# Altium footprint library vertigo.PcbLib: 115 footprints (part 4 of 8)
Each footprint in its own frame and in the unit in brackets; x right, y up, seen from the top. Pads: shape width x height; smd on the part's side, far side on the other; paste and mask are expansions set on the pad; w line width, h text height; cw(c..) or ccw(c..) is an arc to the next point about the centre after c.
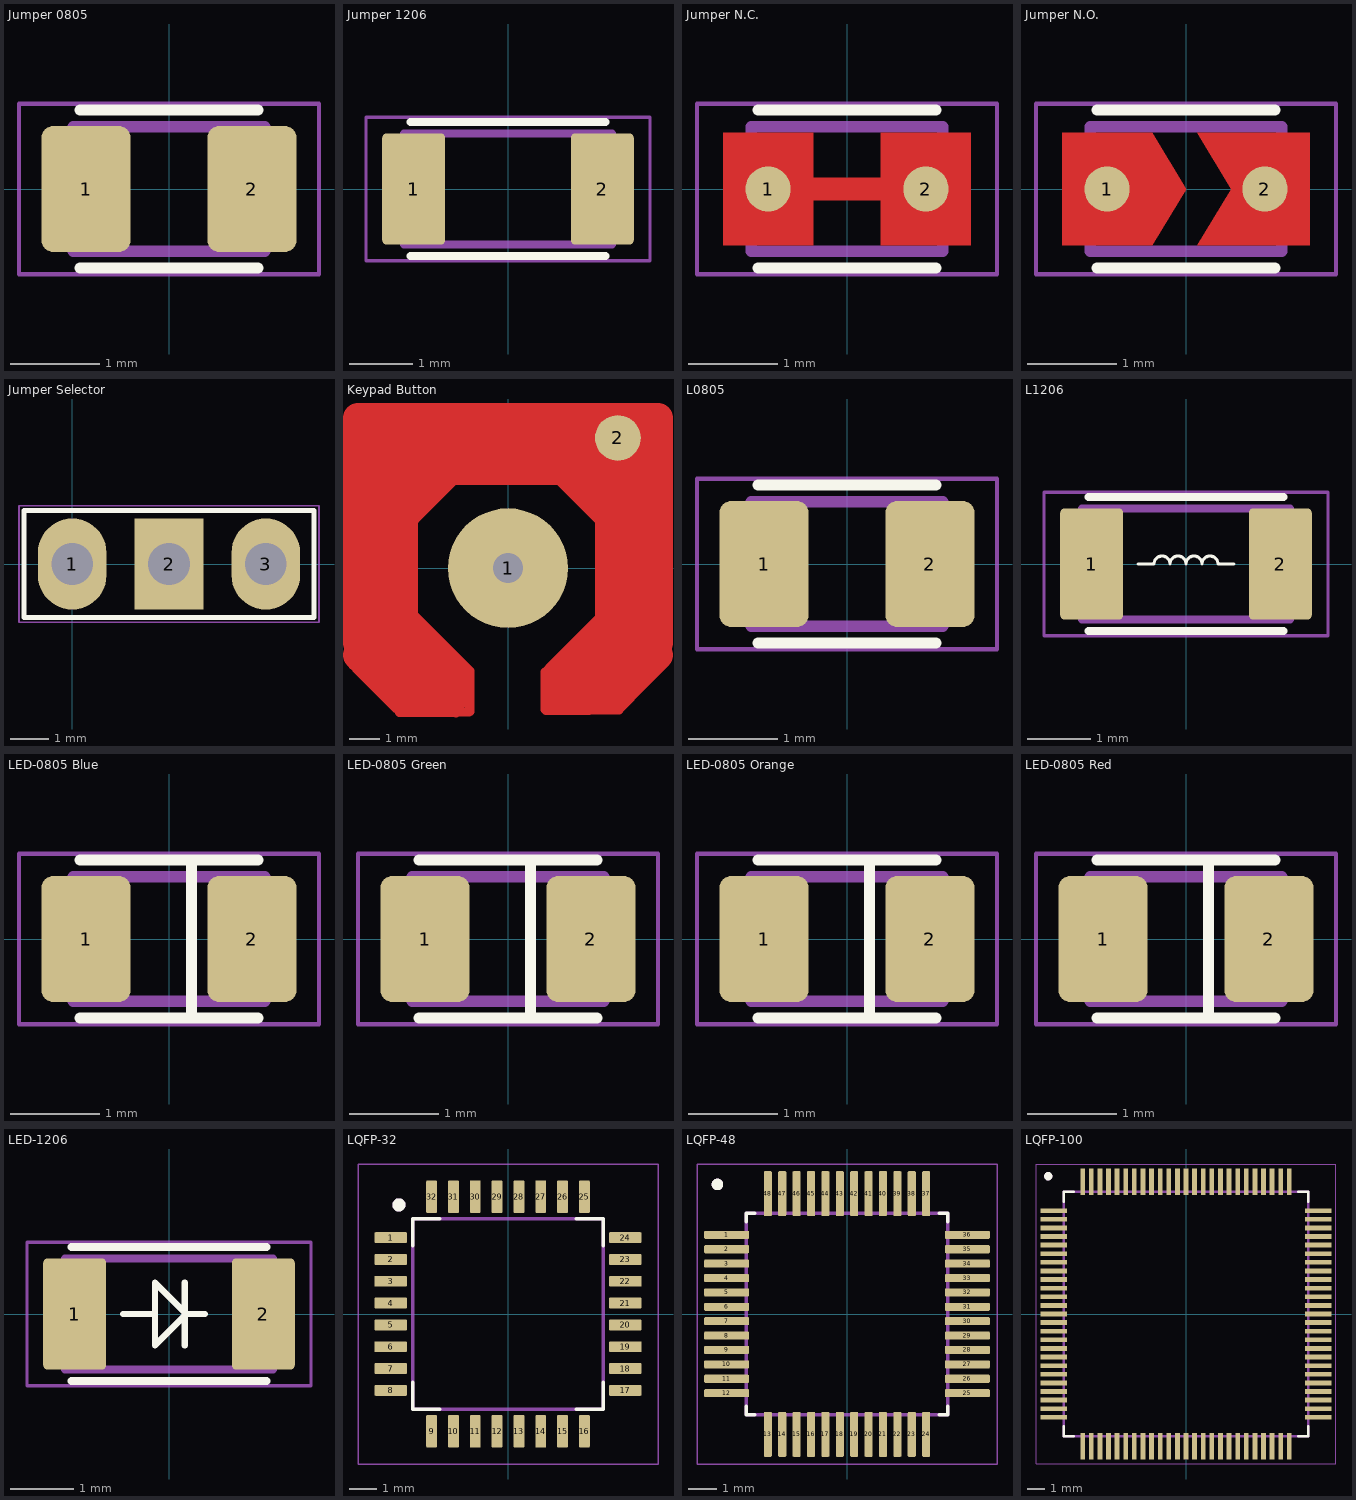
[diagram p3: the footprints below, top view; thin cyan lines are the x and y axes]

## Jumper 0805 [mm] "Zero Res 0805 SMD Package"
pads (2):
  rrect25% 1x1.42 smd: 1(-0.935,0) 2(0.935,0)
Top Overlay:
  lines w0.127: -1,-0.89 1,-0.89 ; -1,0.89 1,0.89
Mechanical 13:
  lines w0.127: -1.08,-0.7 1.08,-0.7 1.08,0.7 -1.08,0.7 -1.08,-0.7
Mechanical 15:
  lines w0.05: -1.69,-0.96 1.69,-0.96 1.69,0.96 -1.69,0.96 -1.69,-0.96

## Jumper 1206 [mm] "Zero Res 1206 SMD Package"
pads (2):
  rrect14% 1x1.77 smd: 1(-1.5,0) 2(1.5,0)
Top Overlay:
  lines w0.127: -1.55,-1.065 1.55,-1.065 ; -1.55,1.065 1.55,1.065
Mechanical 13:
  lines w0.127: -1.65,-0.88 1.65,-0.88 1.65,0.88 -1.65,0.88 -1.65,-0.88
Mechanical 15:
  lines w0.05: -2.26,-1.14 2.26,-1.14 2.26,1.14 -2.26,1.14 -2.26,-1.14

## Jumper N.C. [mil] "Normally-Connected Jumper"
pads (2):
  round 20 smd: 1(-35,0) 2(35,0)
Top Layer:
  region: -55,25 -15,25 -15,5 15,5 15,25 55,25 55,-25 15,-25 15,-5 -15,-5 -15,-25 -55,-25
  lines w10: -35,0 35,0
Top Overlay:
  lines w5: -39.37,-35.04 39.37,-35.04 ; -39.37,35.04 39.37,35.04
Mechanical 13:
  lines w5: -42.52,-27.56 -42.52,27.56 42.52,27.56 42.52,-27.56 -42.52,-27.56
Mechanical 15:
  lines w1.97: -66.54,-37.8 -66.54,37.8 66.54,37.8 66.54,-37.8 -66.54,-37.8

## Jumper N.O. [mil] "Normally-Open Jumper"
pads (2):
  round 20 smd: 1(-35,0) 2(35,0)
Top Layer:
  region: 5,25 20,0 5,-25 55,-25 55,25
  region: -55,25 -15,25 0,0 -15,-25 -55,-25
Top Overlay:
  lines w5: -39.37,-35.04 39.37,-35.04 ; -39.37,35.04 39.37,35.04
Mechanical 13:
  lines w5: -42.52,-27.56 -42.52,27.56 42.52,27.56 42.52,-27.56 -42.52,-27.56
Mechanical 15:
  lines w1.97: -66.54,-37.8 -66.54,37.8 66.54,37.8 66.54,-37.8 -66.54,-37.8

## Jumper Selector [mm] "3-Pin Jumper Selector"
pads (3):
  oval 1.8x2.4 hole 1.1: 1(0,0) 3(5.08,0)
  rect 1.8x2.4 hole 1.1: 2(2.54,0)
Top Overlay:
  lines w0.127: -1.27,-1.4 6.35,-1.4 6.35,1.4 -1.27,1.4 -1.27,-1.4
Mechanical 15:
  lines w0.04: -1.397,-1.524 6.477,-1.524 6.477,1.524 -1.397,1.524 -1.397,-1.524
3D body: height 10.16, standoff 3.05, extent -1.245,-1.27 3.835,1.27
3D body "Header3.STEP": height 8.38, standoff -2.54, extent -1.245,-1.27 6.375,1.27

## Keypad Button [mm]
pads (2):
  round 4 hole 1: 1(0,0)
  round 1.524 smd: 2(3.663,4.343)
Top Layer:
  rectangle: -2.3,2.9 2.1,3.5
  rectangle: -5,3.4 5,5
  rectangle: -5,0.8 -3.4,3.6
  rectangle: 3.6,1 5,3.8
  rectangle: 4.5,-2.5 5,-1.7
  rectangle: 4.5,-1.7 5,-1.6
  rectangle: 4,-2.8 4.8,-2.4
  rectangle: 4.2,-3 4.5,-2.5
  rectangle: -5,-2.6 -4,-0.9
  rectangle: -4.7,-2.8 -4,-2.4
  rectangle: -4.5,-3 -4.1,-2.6
  rectangle: -3.7,-1.7 -3,1.8
  rectangle: 2.9,-1.7 3.5,1.6
  lines w0.254: -5,-2.9 -5,-2.847 -5,-2.7 -5,-2.6 ; -4.5,-3 -4.051,-3.449 -3.6,-3.9 -3.5,-3.9 -3.4,-3.9 ; -4.1,-3 -4.1,-2.847 -4.1,-2.7 -4,-2.6 ; -3.9,-3.3 -3.6,-3.6 -3.4,-3.8 -3.4,-3.9 ; -3.5,-4 -3.4,-4 -2.941,-4 -2.7,-4 ; -3.5,3.4 -3.019,2.919 -2.6,2.5 -2.5,2.5 ; -3.4,-1.3 -2.95,-1.75 -1.95,-2.75 -1.5,-3.2 ; -3.1,1.6 -1.8,2.9 ; -3,-1.8 -2,-2.8 ; -2.6,2.9 -1.8,2.9 ; -2.5,-4.2 -2.941,-4.2 -3.4,-4.2 -3.55,-4.05 -3.65,-3.95 -4.101,-3.499 -4.55,-3.05 -4.753,-2.847 -4.84,-2.76 -4.9,-2.7 -5,-2.6 ; 1.5,3 1.5,3.2 ; 1.6,-3.1 2.2,-2.5 2.3,-2.4 ; 2.3,-2.6 2.3,-2.4 ; 2.7,-4.2 2.9,-4.2 ; 3.1,1.5 1.7,2.9 ; 3.7,2.9 3.038,2.9 1.7,2.9 ; 4,-3 4.35,-2.65 4.5,-2.5 4.5,-1.9 4.8,-1.6 4.8,-1.3 ; 4.01,-3.39 4.15,-3.25 4.44,-2.96 4.44,-2.91 ; 4.1,-3.2 3.96,-3.34 3.466,-3.834 3.4,-3.9 ; 4.8,-2.8 4.25,-3.35 3.616,-3.984 3.55,-4.05 3.4,-4.2 3.37,-4.2 3.235,-4.2 3.231,-4.2 ; 5,-2.9 5,-2.5 4.697,-2.712 4.408,-2.914 4.077,-3.146 3.907,-3.265 3.134,-3.806 3,-3.9 3.2,-3.9 ; -5,-2.6 -5,-2.5 -4.839,-2.613 -4.753,-2.673 -4.714,-2.7 -4.671,-2.73 -4.43,-2.899 -4.302,-2.989 -4.161,-3.087 -3.886,-3.28 -3.544,-3.519 -3,-3.9 -3.4,-3.9 ; -1.8,2.9 1.1,2.9 ; 1.1,2.9 1.2,2.9 ; 1.1,2.9 1.2,2.9 ; 1.2,2.9 1.5,2.9 1.7,2.9 ; 2.3,-2.4 3,-1.7 2.3,-2.4 ; 2.9,-4.2 3.2,-4.2 ; 2.9,-4.2 3.2,-3.9 ; 3.2,-4.2 3.231,-4.2 ; 3.2,-4.2 3.231,-4.2 ; 3.2,-3.9 3.3,-3.9 ; 3.231,-4.2 3.316,-4.116 3.466,-3.966 3.531,-3.9 3.4,-3.9 ; 3.3,-3.9 3.4,-3.9 ; 3.3,-3.9 3.4,-3.9
  lines w0.3: -4.2,-4.1 -4.139,-4.137 -3.576,-4.475 -3.2,-4.7 ; -3.617,-4.812 -3.463,-4.813 -3.201,-4.814 -2.941,-4.816 -1.734,-4.823 ; -3.53,-1.16 -3.395,-1.295 -2.945,-1.745 -1.945,-2.745 -1.495,-3.195 -1.27,-3.42 -1.27,-3.6 -1.27,-4.77 -1.3,-4.773 ; -1.757,-4.812 -1.717,-4.812 ; -1.3,-3.6 -1.3,-4.773 ; 1.264,-4.736 1.4,-4.736 1.95,-4.735 2.7,-4.735 3.672,-4.734 ; 1.4,-4.6 1.469,-4.254 1.5,-4.1 ; 1.54,-3.31 1.5,-3.31 1.24,-3.57 ; 3.21,-1.49 3,-1.7 2.3,-2.4 2.2,-2.5 1.6,-3.1 1.465,-3.235 1.24,-3.46 1.24,-3.57 ; 3.235,-4.2 3.309,-4.282 3.37,-4.35 3.698,-4.713 ; 3.689,-4.722 3.69,-4.72 ; 4.1,-4.3 3.698,-4.713 ; -1.717,-4.812 -1.3,-4.773 ; -1.717,-4.812 -1.3,-4.8 -1.3,-4.773 ; 1.24,-3.76 1.24,-3.57 ; 1.24,-3.76 1.24,-4.71 1.4,-4.711 1.949,-4.713 2.699,-4.716 3.69,-4.72 ; 1.24,-3.76 1.24,-3.57 ; 3.69,-4.72 3.704,-4.72 3.698,-4.713 ; 3.69,-4.72 3.698,-4.713
  lines w1: -5,-2.9 -4.904,-2.997 -4.9,-3.001 -4.753,-3.149 -4.49,-3.414 -4.254,-3.651 -3.954,-3.953 -3.576,-4.334 -3.48,-4.43 -2.941,-4.43 -1.91,-4.43 ; -5,-2.5 -5,-1.75 -5,-1.418 -5,2.666 -5,3.782 -5,5 -4.719,5 -3.068,5 3.3,5 3.663,5 5,5 5,-1.6 5,-1.9 5,-2.5 ; 1.95,-4.35 2.7,-4.35 3,-4.35 3.37,-4.35 3.55,-4.35 3.65,-4.25 3.85,-4.05 4.4,-3.5 4.69,-3.21 5,-2.9
  lines w1.7: -1.972,-3.708 cw(c0,0) -2.688,-3.227 cw(c0,0) -3.019,2.919 cw(c0,0) 3.038,2.9 cw(c0,0) 2.1,-3.637

## L0805 [mm]
pads (2):
  rrect25% 1x1.42 smd: 1(-0.935,0) 2(0.935,0)
Top Overlay:
  lines w0.127: -1,-0.89 1,-0.89 ; -1,0.89 1,0.89
Mechanical 13:
  lines w0.127: -1.08,-0.7 1.08,-0.7 1.08,0.7 -1.08,0.7 -1.08,-0.7
Mechanical 15:
  lines w0.05: -1.69,-0.96 1.69,-0.96 1.69,0.96 -1.69,0.96 -1.69,-0.96
3D body "4-1879028-2.STEP": height 0.6, standoff 0, extent -1,-0.625 1,0.625

## L1206 [mm]
pads (2):
  rrect14% 1x1.77 smd: 1(-1.5,0) 2(1.5,0)
Top Overlay:
  lines w0.05: -0.762,0 -0.508,0 cw(c-0.381,0) -0.254,0 cw(c-0.127,0) 0,0 cw(c0.127,0) 0.254,0 cw(c0.381,0) 0.508,0 0.762,0
  lines w0.127: -1.55,-1.065 1.55,-1.065 ; -1.55,1.065 1.55,1.065
Mechanical 13:
  lines w0.127: -1.65,-0.88 -1.65,0.88 1.65,0.88 1.65,-0.88 -1.65,-0.88
Mechanical 15:
  lines w0.05: -2.26,-1.14 -2.26,1.14 2.26,1.14 2.26,-1.14 -2.26,-1.14
3D body "R1206.STEP": height 0.55, standoff 0, extent -1.55,-0.775 1.55,0.775

## LED-0805 Blue [mm] "SMD 0805 Package"
pads (2):
  rrect25% 1x1.42 smd: 1(-0.935,0) 2(0.935,0)
Top Overlay:
  lines w0.127: -1,-0.89 1,-0.89 ; -1,0.89 1,0.89 ; 0.254,-0.889 0.254,0.889
Mechanical 13:
  lines w0.127: -1.08,-0.7 -1.08,0.7 1.08,0.7 1.08,-0.7 -1.08,-0.7
Mechanical 15:
  lines w0.05: -1.69,-0.96 -1.69,0.96 1.69,0.96 1.69,-0.96 -1.69,-0.96
3D body "SMD_0805LED_BLU.STEP": height 1.1, standoff 0, extent -1.01,-0.625 1.01,0.625

## LED-0805 Green [mm] "SMD 0805 Package"
pads (2):
  rrect25% 1x1.42 smd: 1(-0.935,0) 2(0.935,0)
Top Overlay:
  lines w0.127: -1,-0.89 1,-0.89 ; -1,0.89 1,0.89 ; 0.254,-0.889 0.254,0.889
Mechanical 13:
  lines w0.127: -1.08,-0.7 1.08,-0.7 1.08,0.7 -1.08,0.7 -1.08,-0.7
Mechanical 15:
  lines w0.05: -1.69,-0.96 1.69,-0.96 1.69,0.96 -1.69,0.96 -1.69,-0.96
3D body "SMD_0805LED_GREEN.STEP": height 1.1, standoff 0, extent -1.01,-0.625 1.01,0.625

## LED-0805 Orange [mm] "SMD 0805 Package"
pads (2):
  rrect25% 1x1.42 smd: 1(-0.935,0) 2(0.935,0)
Top Overlay:
  lines w0.127: -1,-0.89 1,-0.89 ; -1,0.89 1,0.89 ; 0.254,-0.889 0.254,0.889
Mechanical 13:
  lines w0.127: -1.08,-0.7 1.08,-0.7 1.08,0.7 -1.08,0.7 -1.08,-0.7
Mechanical 15:
  lines w0.05: -1.69,-0.96 1.69,-0.96 1.69,0.96 -1.69,0.96 -1.69,-0.96
3D body "SMD_0805LED_YEL.STEP": height 1.1, standoff 0, extent -1.01,-0.625 1.01,0.625

## LED-0805 Red [mm] "SMD 0805 Package"
pads (2):
  rrect25% 1x1.42 smd: 1(-0.935,0) 2(0.935,0)
Top Overlay:
  lines w0.127: -1,-0.89 1,-0.89 ; -1,0.89 1,0.89 ; 0.254,-0.889 0.254,0.889
Mechanical 13:
  lines w0.127: -1.08,-0.7 1.08,-0.7 1.08,0.7 -1.08,0.7 -1.08,-0.7
Mechanical 15:
  lines w0.05: -1.69,-0.96 1.69,-0.96 1.69,0.96 -1.69,0.96 -1.69,-0.96
3D body "SMD_0805LED_RED.STEP": height 1.1, standoff 0, extent -1.01,-0.625 1.01,0.625

## LED-1206 [mm] "SMD 1206 Package"
pads (2):
  rrect14% 1x1.77 smd: 1(-1.5,0) 2(1.5,0)
Top Overlay:
  lines w0.1: -0.727,0 -0.254,0 ; 0.25,-0.5 0.25,0.5 ; 0.254,0 0.573,0 ; -0.223,-0.5 0.277,0 -0.223,0.5 -0.223,-0.5
  lines w0.127: -1.55,-1.065 1.55,-1.065 ; -1.55,1.065 1.55,1.065
Mechanical 13:
  lines w0.127: -1.65,-0.88 1.65,-0.88 1.65,0.88 -1.65,0.88 -1.65,-0.88
Mechanical 15:
  lines w0.05: -2.26,-1.14 2.26,-1.14 2.26,1.14 -2.26,1.14 -2.26,-1.14
3D body "SW3dPS-LED1206R.STEP": height 1.11, standoff -0.4, extent -1.576,-0.787 1.624,0.813

## LQFP-32 [mm] "LQFP-32 Package"
pads (32):
  rrect25% 1.2x0.4 smd: 1(-4.3,2.8) 2(-4.3,2) 3(-4.3,1.2) 4(-4.3,0.4) 5(-4.3,-0.4) 6(-4.3,-1.2) 7(-4.3,-2) 8(-4.3,-2.8) 17(4.3,-2.8) 18(4.3,-2) 19(4.3,-1.2) 20(4.3,-0.4) 21(4.3,0.4) 22(4.3,1.2) 23(4.3,2) 24(4.3,2.8)
  rrect25% 0.4x1.2 smd: 9(-2.8,-4.3) 10(-2,-4.3) 11(-1.2,-4.3) 12(-0.4,-4.3) 13(0.4,-4.3) 14(1.2,-4.3) 15(2,-4.3) 16(2.8,-4.3) 25(2.8,4.3) 26(2,4.3) 27(1.2,4.3) 28(0.4,4.3) 29(-0.4,4.3) 30(-1.2,4.3) 31(-2,4.3) 32(-2.8,4.3)
Top Overlay:
  circle w0.24: c-4,4 r0.12
  lines w0.127: -3.5,-2.5 -3.5,-3.5 -2.5,-3.5 ; -3.5,2.5 -3.5,3.5 -2.5,3.5 ; 2.5,-3.5 3.5,-3.5 3.5,-2.5 ; 2.5,3.5 3.5,3.5 3.5,2.5
Mechanical 13:
  circle w0.24: c-4,4 r0.12
  lines w0.127: -3.5,-3.5 -3.5,3.5 3.5,3.5 3.5,-3.5 -3.5,-3.5
Mechanical 15:
  lines w0.05: -5.5,-5.5 5.5,-5.5 5.5,5.5 -5.5,5.5 -5.5,-5.5
3D body "FT232BL.STEP": height 1.6, standoff 0, extent -4.5,-4.5 4.5,4.5

## LQFP-48 [mm] "LQFP-48 Package"
pads (48):
  rrect25% 1.56x0.28 smd: 1(-4.18,2.75) 2(-4.18,2.25) 3(-4.18,1.75) 4(-4.18,1.25) 5(-4.18,0.75) 6(-4.18,0.25) 7(-4.18,-0.25) 8(-4.18,-0.75) 9(-4.18,-1.25) 10(-4.18,-1.75) 11(-4.18,-2.25) 12(-4.18,-2.75) 25(4.18,-2.75) 26(4.18,-2.25) 27(4.18,-1.75) 28(4.18,-1.25) 29(4.18,-0.75) 30(4.18,-0.25) 31(4.18,0.25) 32(4.18,0.75) 33(4.18,1.25) 34(4.18,1.75) 35(4.18,2.25) 36(4.18,2.75)
  rrect25% 0.28x1.56 smd: 13(-2.75,-4.18) 14(-2.25,-4.18) 15(-1.75,-4.18) 16(-1.25,-4.18) 17(-0.75,-4.18) 18(-0.25,-4.18) 19(0.25,-4.18) 20(0.75,-4.18) 21(1.25,-4.18) 22(1.75,-4.18) 23(2.25,-4.18) 24(2.75,-4.18) 37(2.75,4.18) 38(2.25,4.18) 39(1.75,4.18) 40(1.25,4.18) 41(0.75,4.18) 42(0.25,4.18) 43(-0.25,4.18) 44(-0.75,4.18) 45(-1.25,4.18) 46(-1.75,4.18) 47(-2.25,4.18) 48(-2.75,4.18)
Top Overlay:
  circle w0.2: c-4.5,4.5 r0.1
  lines w0.127: -3.5,-3.21 -3.5,-3.5 -3.21,-3.5 ; -3.5,3.21 -3.5,3.5 -3.21,3.5 ; 3.21,-3.5 3.5,-3.5 3.5,-3.21 ; 3.21,3.5 3.5,3.5 3.5,3.21
Mechanical 13:
  circle w0.2: c-4.5,4.5 r0.1
  lines w0.127: -3.5,-3.5 -3.5,3.5 3.5,3.5 3.5,-3.5 -3.5,-3.5
Mechanical 15:
  lines w0.05: -5.21,-5.21 -5.21,5.21 5.21,5.21 5.21,-5.21 -5.21,-5.21
3D body "FS32K144UAT0VLFT.STEP": height 1.6, standoff 0, extent -4.5,-4.5 4.5,4.5

## LQFP-100 [mm] "LQFP-100 Package"
pads (100):
  rrect25% 1.56x0.28 smd: 1(-7.68,6) 2(-7.68,5.5) 3(-7.68,5) 4(-7.68,4.5) 5(-7.68,4) 6(-7.68,3.5) 7(-7.68,3) 8(-7.68,2.5) 9(-7.68,2) 10(-7.68,1.5) 11(-7.68,1) 12(-7.68,0.5) 13(-7.68,0) 14(-7.68,-0.5) 15(-7.68,-1) 16(-7.68,-1.5) 17(-7.68,-2) 18(-7.68,-2.5) 19(-7.68,-3) 20(-7.68,-3.5) 21(-7.68,-4) 22(-7.68,-4.5) 23(-7.68,-5) 24(-7.68,-5.5) 25(-7.68,-6) 51(7.68,-6) 52(7.68,-5.5) 53(7.68,-5) 54(7.68,-4.5) 55(7.68,-4) 56(7.68,-3.5) 57(7.68,-3) 58(7.68,-2.5) 59(7.68,-2) 60(7.68,-1.5) 61(7.68,-1) 62(7.68,-0.5) 63(7.68,0) 64(7.68,0.5) 65(7.68,1) 66(7.68,1.5) 67(7.68,2) 68(7.68,2.5) 69(7.68,3) 70(7.68,3.5) 71(7.68,4) 72(7.68,4.5) 73(7.68,5) 74(7.68,5.5) 75(7.68,6)
  rrect25% 0.28x1.56 smd: 26(-6,-7.68) 27(-5.5,-7.68) 28(-5,-7.68) 29(-4.5,-7.68) 30(-4,-7.68) 31(-3.5,-7.68) 32(-3,-7.68) 33(-2.5,-7.68) 34(-2,-7.68) 35(-1.5,-7.68) 36(-1,-7.68) 37(-0.5,-7.68) 38(0,-7.68) 39(0.5,-7.68) 40(1,-7.68) 41(1.5,-7.68) 42(2,-7.68) 43(2.5,-7.68) 44(3,-7.68) 45(3.5,-7.68) 46(4,-7.68) 47(4.5,-7.68) 48(5,-7.68) 49(5.5,-7.68) 50(6,-7.68) 76(6,7.68) 77(5.5,7.68) 78(5,7.68) 79(4.5,7.68) 80(4,7.68) 81(3.5,7.68) 82(3,7.68) 83(2.5,7.68) 84(2,7.68) 85(1.5,7.68) 86(1,7.68) 87(0.5,7.68) 88(0,7.68) 89(-0.5,7.68) 90(-1,7.68) 91(-1.5,7.68) 92(-2,7.68) 93(-2.5,7.68) 94(-3,7.68) 95(-3.5,7.68) 96(-4,7.68) 97(-4.5,7.68) 98(-5,7.68) 99(-5.5,7.68) 100(-6,7.68)
Top Overlay:
  circle w0.24: c-8,8 r0.12
  lines w0.127: -7.1,-6.5 -7.1,-7.1 -6.5,-7.1 ; -7.1,6.5 -7.1,7.1 -6.5,7.1 ; 6.5,-7.1 7.1,-7.1 7.1,-6.5 ; 6.5,7.1 7.1,7.1 7.1,6.5
Mechanical 13:
  circle w0.24: c-8.001,8.001 r0.12
  lines w0.127: -7.1,-7.1 7.1,-7.1 7.1,7.1 -7.1,7.1 -7.1,-7.1
Mechanical 15:
  lines w0.05: -8.71,-8.71 8.71,-8.71 8.71,8.71 -8.71,8.71 -8.71,-8.71
3D body "STM32F107VCT6.STEP": height 1.6, standoff 0, extent -8,-8 8,8